# Altium footprint library TarabusLibrary.PcbLib: 591 footprints (part 24 of 37)
Each footprint in its own frame and in the unit in brackets; x right, y up, seen from the top. Pads: shape width x height; smd on the part's side, far side on the other; paste and mask are expansions set on the pad; w line width, h text height; cw(c..) or ccw(c..) is an arc to the next point about the centre after c.
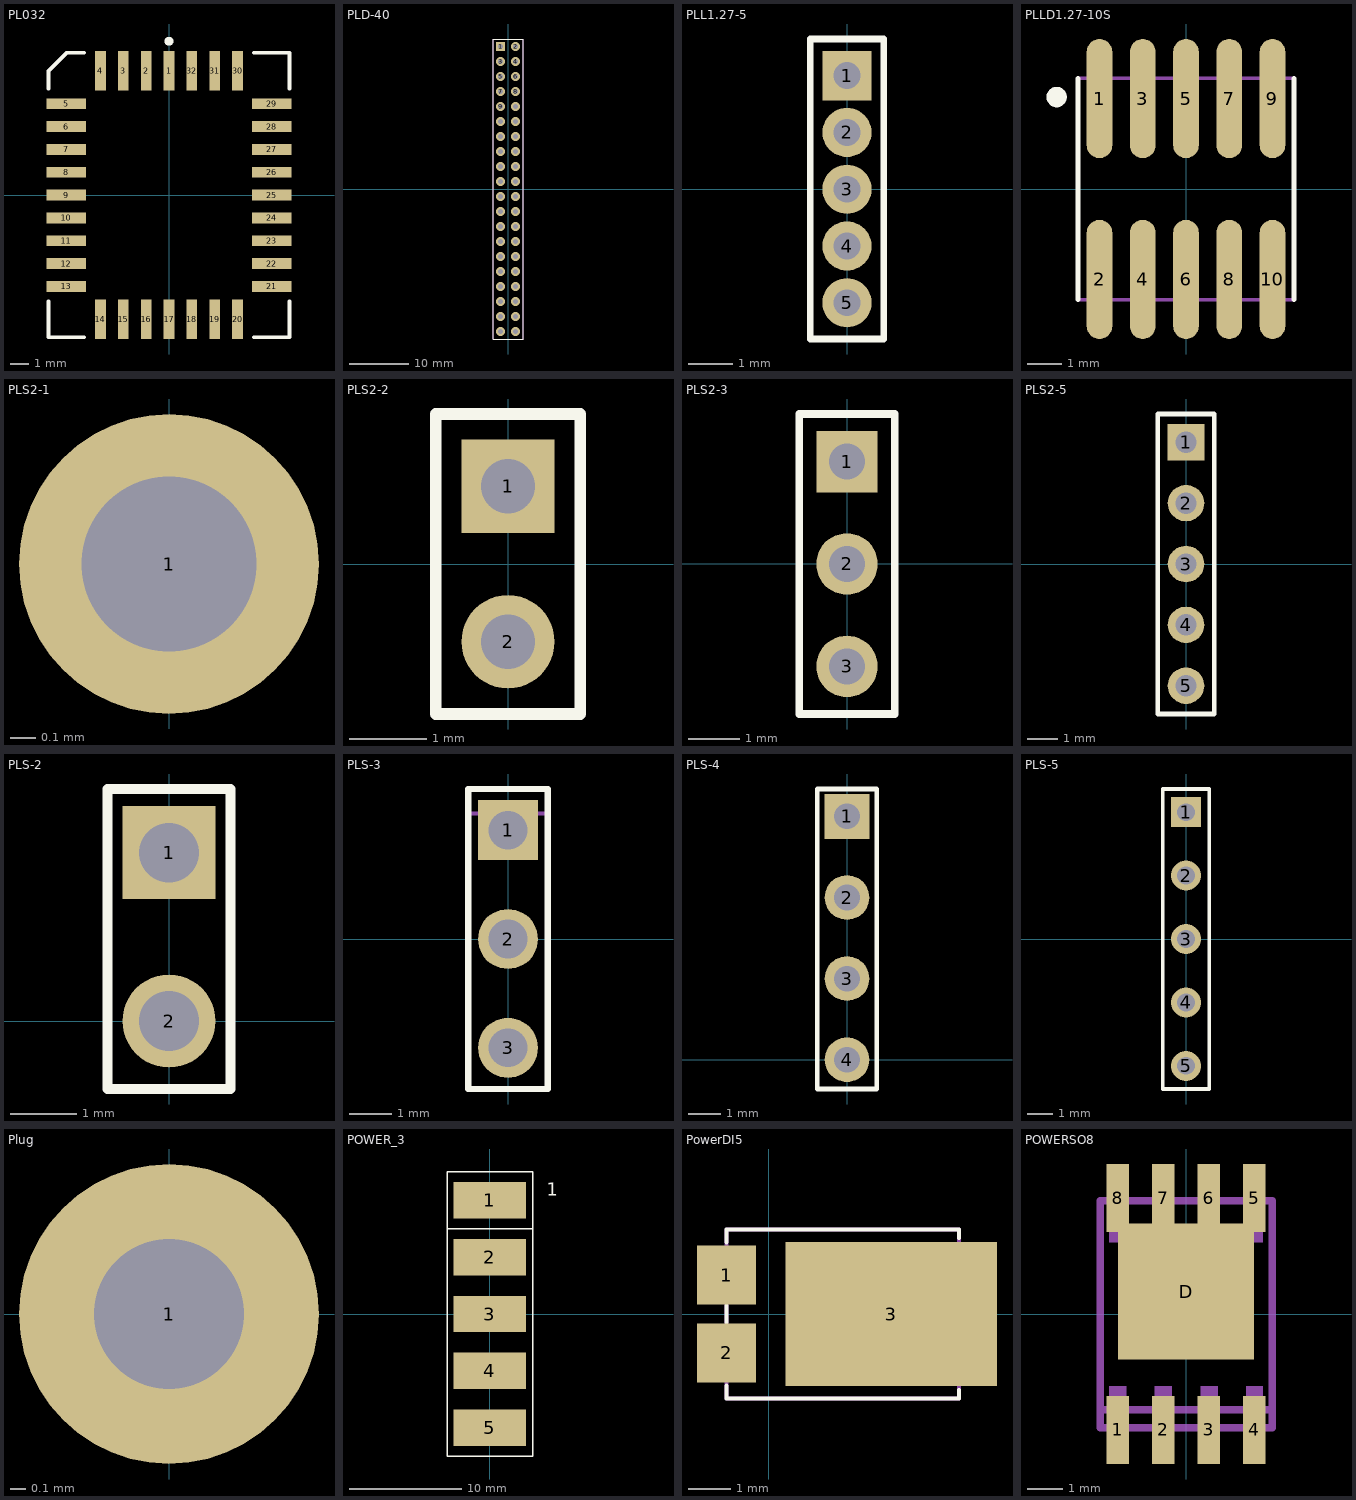
[diagram p23: the footprints below, top view; thin cyan lines are the x and y axes]

## PL032 [mm] "Leaded Chip Carrier, Plastic; 32 Leads; Body 11.4 x 14 mm"
height 3.56
pads (32):
  rect 0.6x2.2 smd: 1(0,6.9) 2(-1.27,6.9) 3(-2.54,6.9) 4(-3.81,6.9) 14(-3.81,-6.9) 15(-2.54,-6.9) 16(-1.27,-6.9) 17(0,-6.9) 18(1.27,-6.9) 19(2.54,-6.9) 20(3.81,-6.9) 30(3.81,6.9) 31(2.54,6.9) 32(1.27,6.9)
  rect 2.2x0.6 smd: 5(-5.7,5.08) 6(-5.7,3.81) 7(-5.7,2.54) 8(-5.7,1.27) 9(-5.7,0) 10(-5.7,-1.27) 11(-5.7,-2.54) 12(-5.7,-3.81) 13(-5.7,-5.08) 21(5.7,-5.08) 22(5.7,-3.81) 23(5.7,-2.54) 24(5.7,-1.27) 25(5.7,0) 26(5.7,1.27) 27(5.7,2.54) 28(5.7,3.81) 29(5.7,5.08)
Top Overlay:
  circle w0.25: c0,8.55 r0.125
  lines w0.2: -6.7,-5.9 -6.7,-7.9 -4.7,-7.9 ; -6.7,5.9 -6.7,6.9 -5.7,7.9 -4.7,7.9 ; 4.7,-7.9 6.7,-7.9 6.7,-5.9 ; 4.7,7.9 6.7,7.9 6.7,5.9

## PLD-40 [mm]
height 0.05
pads (40):
  rect 1.5x1.5 hole 0.9: 1(-1.27,24.13)
  round 1.5 hole 0.9: 2(1.27,24.13) 3(-1.27,21.59) 4(1.27,21.59) 5(-1.27,19.05) 6(1.27,19.05) 7(-1.27,16.51) 8(1.27,16.51) 9(-1.27,13.97) 10(1.27,13.97) 11(-1.27,11.43) 12(1.27,11.43) 13(-1.27,8.89) 14(1.27,8.89) 15(-1.27,6.35) 16(1.27,6.35) 17(-1.27,3.81) 18(1.27,3.81) 19(-1.27,1.27) 20(1.27,1.27) 21(-1.27,-1.27) 22(1.27,-1.27) 23(-1.27,-3.81) 24(1.27,-3.81) 25(-1.27,-6.35) 26(1.27,-6.35) 27(-1.27,-8.89) 28(1.27,-8.89) 29(-1.27,-11.43) 30(1.27,-11.43) 31(-1.27,-13.97) 32(1.27,-13.97) 33(-1.27,-16.51) 34(1.27,-16.51) 35(-1.27,-19.05) 36(1.27,-19.05) 37(-1.27,-21.59) 38(1.27,-21.59) 39(-1.27,-24.13) 40(1.27,-24.13)
Top Overlay:
  lines w0.15: -2.54,-25.4 2.54,-25.4 2.54,25.4 -2.54,25.4 -2.54,-25.4
Mechanical 7:
  lines w0.1: -2.54,-25.4 -2.54,25.4 2.54,25.4 2.54,-25.4 -2.54,-25.4
Mechanical 10:
  text ".Comment" at -0.43,25.94 h0.6
  text ".Designator" at -0.54,26.67 h0.8
3D body: height 0.05, standoff 0, extent -2.54,-25.4 2.54,25.4

## PLL1.27-5 [mm]
height 0.05
pads (5):
  rect 1.1x1.1 hole 0.6: 1(0,2.54)
  round 1.1 hole 0.6: 2(0,1.27) 3(0,0) 4(0,-1.27) 5(0,-2.54)
Top Overlay:
  lines w0.15: -0.82,-3.35 0.82,-3.35 0.82,3.36 -0.82,3.36 -0.82,-3.35
Mechanical 7:
  lines w0.1: -0.82,-3.35 0.82,-3.35 0.82,3.36 -0.82,3.36 -0.82,-3.35
Mechanical 10:
  text ".Designator" at -0.4,3.76 h0.8
  text ".Comment" at -0.34,-4.16 h0.6
3D body: height 0.05, standoff 0, extent -0.82,-3.35 0.82,3.36

## PLLD1.27-10S [mm] "PLDD-1.27"
height 5
pads (10):
  oval 0.75x3.5 smd: 1(-2.54,2.655) 2(-2.54,-2.655) 3(-1.27,2.655) 4(-1.27,-2.655) 5(0,2.655) 6(0,-2.655) 7(1.27,2.655) 8(1.27,-2.655) 9(2.54,2.655) 10(2.54,-2.655)
Top Overlay:
  circle w0.3: c-3.8,2.7 r0.15
  lines w0.15: -3.175,-3.25 -3.175,3.25 ; 3.175,-3.25 3.175,3.25
Mechanical 7:
  lines w0.1: -3.175,-3.25 3.175,-3.25 3.175,3.25 -3.175,3.25 -3.175,-3.25
3D body: height 5, standoff 0, extent -3.175,-3.25 3.175,3.25

## PLS2-1 [mm]
height 0.05
pads (1):
  round 1.2 hole 0.7: 1(0,-1)
Mechanical 10:
  text ".Designator" at -0.55,0.075 h0.8
  text ".Comment" at -0.5,-2.275 h0.6

## PLS2-2 [mm]
height 0.05
pads (2):
  rect 1.2x1.2 hole 0.7: 1(0,1)
  round 1.2 hole 0.7: 2(0,-1)
Top Overlay:
  lines w0.15: -0.93,-1.93 0.93,-1.93 0.93,1.93 -0.93,1.93 -0.93,-1.93
Mechanical 7:
  lines w0.1: -0.93,-1.93 0.93,-1.93 0.93,1.93 -0.93,1.93 -0.93,-1.93
Mechanical 10:
  text ".Comment" at -0.6,-2.62 h0.6
  text ".Designator" at -0.55,2.34 h0.8

## PLS2-3 [mm]
height 0.05
pads (3):
  rect 1.2x1.2 hole 0.7: 1(0,2)
  round 1.2 hole 0.7: 2(0,0) 3(0,-2)
Top Overlay:
  lines w0.15: -0.93,-2.93 -0.93,2.93 0.93,2.93 0.93,-2.93 -0.93,-2.93
Mechanical 7:
  lines w0.1: -0.93,-2.93 -0.93,2.93 0.93,2.93 0.93,-2.93 -0.93,-2.93
Mechanical 10:
  text ".Comment" at -0.6,-3.5 h0.6
  text ".Designator" at -0.55,3.34 h0.8

## PLS2-5 [mm]
height 0.05
pads (5):
  rect 1.2x1.2 hole 0.7: 1(0,4)
  round 1.2 hole 0.7: 2(0,2) 3(0,0) 4(0,-2) 5(0,-4)
Top Overlay:
  lines w0.15: -0.93,-4.93 0.93,-4.93 0.93,4.93 -0.93,4.93 -0.93,-4.93
Mechanical 7:
  lines w0.1: -0.93,-4.93 0.93,-4.93 0.93,4.93 -0.93,4.93 -0.93,-4.93
Mechanical 10:
  text ".Designator" at -0.55,5.34 h0.8
  text ".Comment" at -0.45,-5.59 h0.6

## PLS-2 [mm]
height 0.05
pads (2):
  rect 1.4x1.4 hole 0.9: 1(0,2.54)
  round 1.4 hole 0.9: 2(0,0)
Top Overlay:
  lines w0.15: -0.93,-1.025 0.93,-1.025 0.93,3.5 -0.93,3.5 -0.93,-1.025
Mechanical 7:
  lines w0.1: -0.93,-1.025 0.93,-1.025 0.93,3.5 -0.93,3.5 -0.93,-1.025
Mechanical 10:
  text ".Designator" at -1.5,3.5 h0.8
  text ".Comment" at -1,-1.575 h0.6

## PLS-3 [mm]
height 0.05
pads (3):
  rect 1.4x1.4 hole 0.9: 1(0,2.54)
  round 1.4 hole 0.9: 2(0,0) 3(0,-2.54)
Top Overlay:
  lines w0.15: -0.93,-3.5 0.93,-3.5 0.93,3.5 -0.93,3.5 -0.93,-3.5
Mechanical 7:
  lines w0.1: -0.93,-3.499 0.93,-3.499 0.93,2.93 -0.93,2.93 -0.93,-3.499
Mechanical 10:
  text ".Designator" at -1.5,3.5 h0.8
  text ".Comment" at -0.675,-4 h0.6

## PLS-4 [mm]
height 0.05
pads (4):
  rect 1.4x1.4 hole 0.8: 1(0,7.62)
  round 1.4 hole 0.8: 2(0,5.08) 3(0,2.54)
  round 1.4 hole 0.8 mask+0.102: 4(0,0)
Top Overlay:
  lines w0.15: -0.93,-0.92 -0.93,8.48 0.93,8.48 0.93,-0.92 -0.93,-0.92
Mechanical 7:
  lines w0.1: -0.93,-0.92 -0.93,8.48 0.93,8.48 0.93,-0.92 -0.93,-0.92
Mechanical 10:
  text ".Comment" at 1.1,-0.3 h0.6
  text ".Designator" at 1.2,8.4 h0.8

## PLS-5 [mm]
height 0.05
pads (5):
  rect 1.2x1.2 hole 0.7: 1(0,5.08)
  round 1.2 hole 0.7: 2(0,2.54) 3(0,0) 4(0,-2.54) 5(0,-5.08)
Top Overlay:
  lines w0.15: -0.93,-6 -0.93,6 0.93,6 0.93,-6 -0.93,-6
Mechanical 7:
  lines w0.1: -0.93,-6 -0.93,6 0.93,6 0.93,-6 -0.93,-6
Mechanical 10:
  text ".Comment" at -0.93,-6.5 h0.6
  text ".Designator" at -0.93,6.5 h0.8

## Plug [mm]
pads (1):
  round 2 hole 1 mask+0: 1(0,0)
3D body: height 30, standoff 0, extent -0.43,-0.24 0.43,0.24

## POWER_3 [mil]
pads (5):
  rect 254x128 smd: 1(0,400) 2(0,200) 3(0,0) 4(0,-200) 5(0,-400)
Top Overlay:
  lines w5: -150,300 -150,500 150,500 150,300 ; -150,300 150,300 ; -150,300 -150,-500 150,-500 150,300
  text "1" at 200,400 h77.5

## PowerDI5 [mm]
pads (3):
  rect 1.4x1.4 smd mask+0: 1(-1,0.92) 2(-1,-0.92)
  rect 5x3.4 smd mask+0: 3(2.9,0)
Top Overlay:
  lines w0.1: -1,-1.7 -1,-2 4.5,-2 4.5,-1.8 ; -1,-0.2 -1,0.2 ; -1,1.7 -1,2 4.5,2 4.5,1.8
Mechanical 7:
  lines w0.1: -1,-2 -1,2 4.5,2 4.5,-2 -1,-2
Mechanical 10:
  text ".Designator" at 1.83,3.13 h0.8
  text ".Comment" at 1.94,2.4 h0.6
3D body: height 1, standoff 0, extent -1,-2 4.5,2

## POWERSO8 [mm]
pads (9):
  rect 0.635x1.905 smd: 1(-1.905,-3.235) 2(-0.635,-3.235) 3(0.635,-3.235) 4(1.905,-3.235) 5(1.905,3.251) 6(0.635,3.251) 7(-0.635,3.251) 8(-1.905,3.251)
  rect 3.81x3.81 smd: D(0,0.635)
Mechanical 16:
  rectangle: -2.15,2.007 -1.66,3.124
  rectangle: -0.88,2.007 -0.39,3.124
  rectangle: 0.406,2.007 0.889,3.124
  rectangle: 1.676,2.007 2.159,3.124
  rectangle: 1.676,-3.1 2.159,-2
  rectangle: 0.406,-3.1 0.889,-2
  rectangle: -0.88,-3.1 -0.39,-2
  rectangle: -2.15,-3.1 -1.66,-2
  lines w0.203: -2.4,-2.67 2.413,-2.67 ; -2.4,-2.67 -2.4,3.175 2.413,3.175 2.413,-2.67 ; -2.4,-2.67 -2.4,-3.17 2.413,-3.17 2.413,-2.67